# Altium footprint library BRT_Components.PcbLib: 132 footprints (part 8 of 9)
Each footprint in its own frame and in the unit in brackets; x right, y up, seen from the top. Pads: shape width x height; smd on the part's side, far side on the other; paste and mask are expansions set on the pad; w line width, h text height; cw(c..) or ccw(c..) is an arc to the next point about the centre after c.
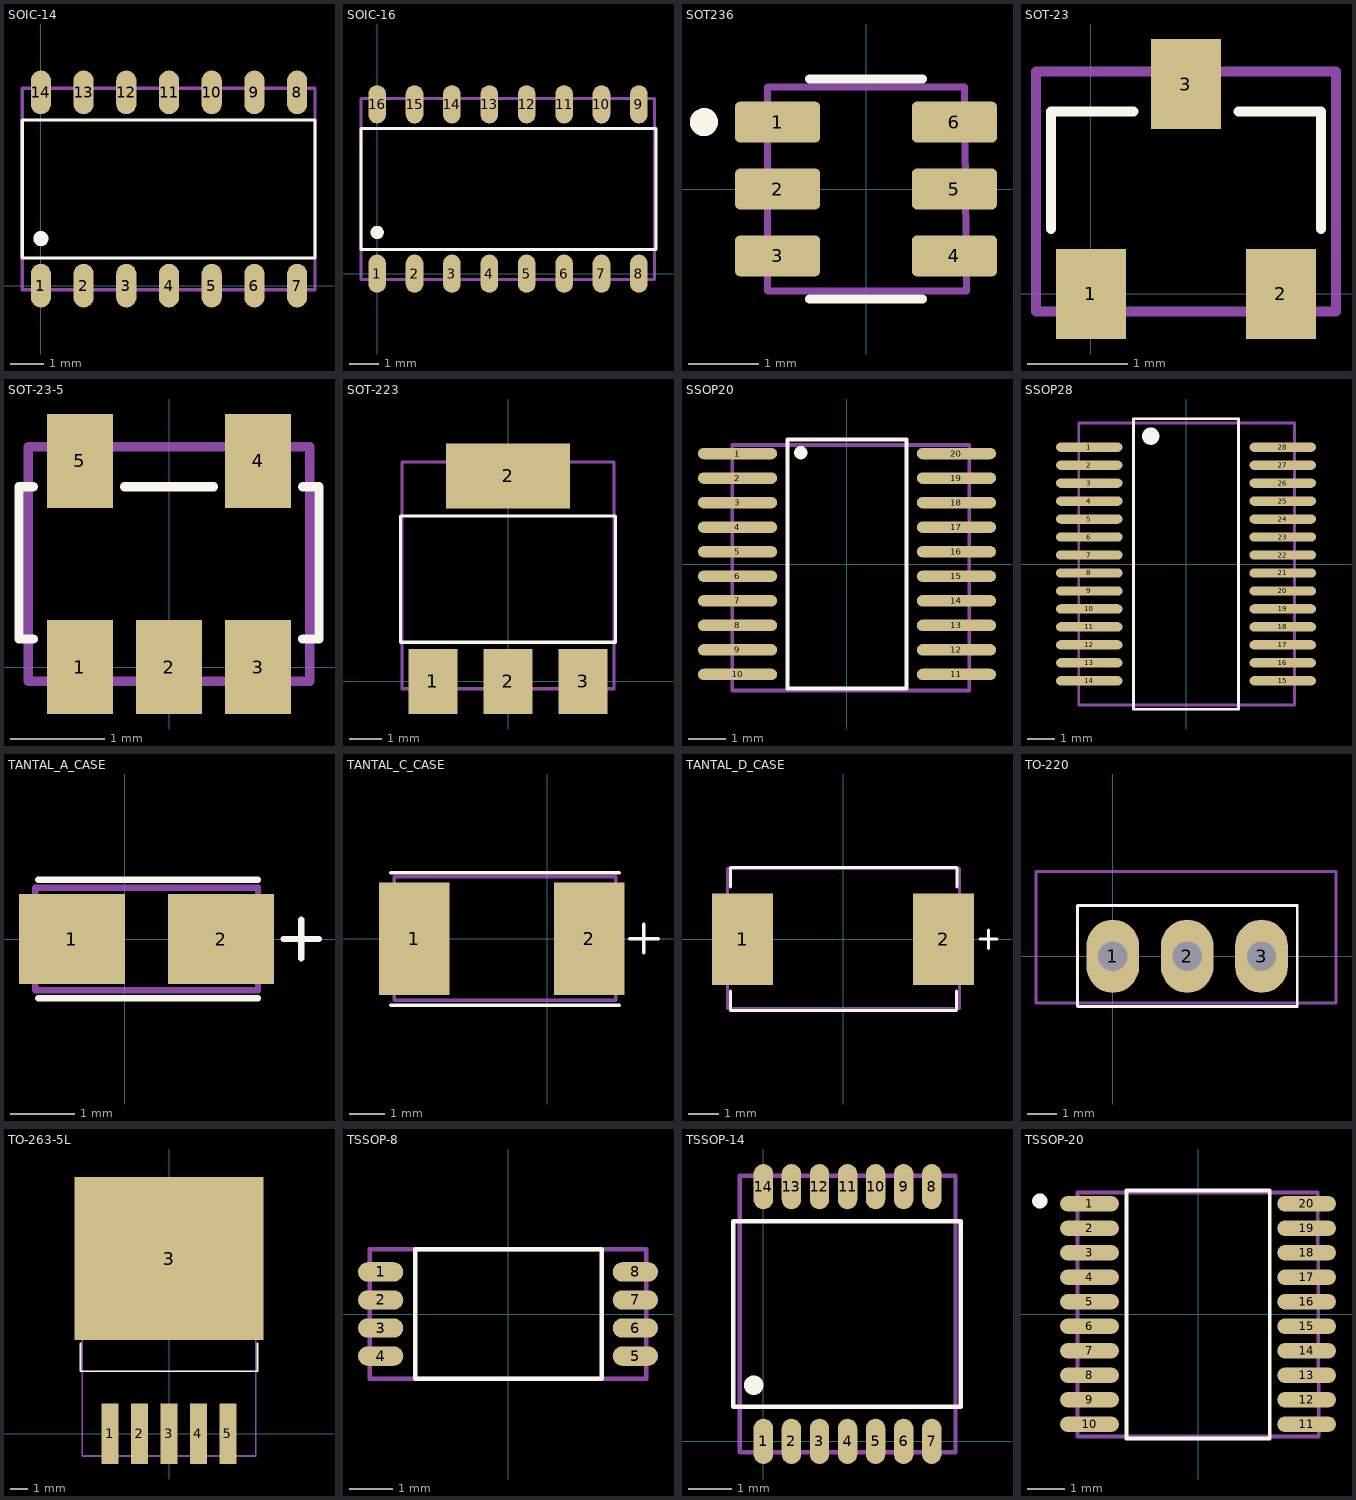
[diagram p7: the footprints below, top view; thin cyan lines are the x and y axes]

## SOIC-14 [mm]
pads (14):
  oval 0.6x1.3 smd paste+0 mask+0.1: 1(0,0) 2(1.27,0) 3(2.54,0) 4(3.81,0) 5(5.08,0) 6(6.35,0) 7(7.62,0) 8(7.62,5.75) 9(6.35,5.75) 10(5.08,5.75) 11(3.81,5.75) 12(2.54,5.75) 13(1.27,5.75) 14(0,5.75)
Top Overlay:
  circle w0.25: c0,1.4 r0.1
  lines w0.1: -0.55,0.825 8.15,0.825 8.15,4.925 -0.55,4.925 -0.55,0.825
Mechanical 13:
  lines w0.1: -0.55,-0.125 -0.55,5.875 8.15,5.875 8.15,-0.125 -0.55,-0.125
3D body "step_temp.STEP": height 1.75, standoff 0, extent -0.525,-0.125 8.125,5.875

## SOIC-16 [mm]
pads (16):
  oval 0.6x1.3 smd paste+0 mask+0.1: 1(0,0) 2(1.27,0) 3(2.54,0) 4(3.81,0) 5(5.08,0) 6(6.35,0) 7(7.62,0) 8(8.89,0) 9(8.89,5.75) 10(7.62,5.75) 11(6.35,5.75) 12(5.08,5.75) 13(3.81,5.75) 14(2.54,5.75) 15(1.27,5.75) 16(0,5.75)
Top Overlay:
  circle w0.25: c0,1.4 r0.1
  lines w0.1: -0.55,0.825 -0.55,4.925 9.475,4.925 9.475,0.825 -0.55,0.825
Mechanical 13:
  lines w0.1: -0.55,-0.2 9.425,-0.2 9.425,5.95 -0.55,5.95 -0.55,-0.2
3D body "User Library-so16-1.step": height 1.78, standoff 0.01, extent -0.535,-0.193 9.435,5.944

## SOT236 [mm]
pads (6):
  rrect25% 1.21x0.58 smd: 1(-1.255,0.95) 2(-1.255,0) 3(-1.255,-0.95) 4(1.255,-0.95) 5(1.255,0) 6(1.255,0.95)
Top Overlay:
  circle w0.2: c-2.3,0.95 r0.1
  lines w0.127: -0.8,-1.56 0.8,-1.56 ; -0.8,1.56 0.8,1.56
Mechanical 13:
  lines w0.1: -1.4,-1.45 -1.4,1.45 1.4,1.45 1.425,-1.45 -1.4,-1.45
3D body "TPD2S017DBVR.STEP": height 1.45, standoff 0, extent -1.4,-1.45 1.4,1.45

## SOT-23 [mm]
pads (3):
  rect 0.7x0.9 smd: 1(0,0) 2(1.9,0) 3(0.95,2.1)
Top Overlay:
  lines w0.1: -0.4,0.65 -0.4,1.825 0.425,1.825 ; 1.475,1.825 2.3,1.825 2.3,0.65
Mechanical 13:
  lines w0.1: -0.55,-0.175 -0.55,2.225 2.45,2.225 2.45,-0.175 -0.55,-0.175
3D body "sot23 v2.step": height 1.1, standoff 0, extent -0.55,-0.175 2.45,2.225

## SOT-23-5 [mm]
pads (5):
  rect 0.7x1 smd mask+0.045: 1(-0.95,0) 2(0,0) 3(0.95,0) 4(0.95,2.2) 5(-0.95,2.2)
Top Overlay:
  lines w0.1: -1.45,0.3 -1.6,0.3 -1.6,1.925 -1.45,1.925 ; -0.475,1.925 0.475,1.925 ; 1.425,0.3 1.6,0.3 1.6,1.925 1.425,1.925
Mechanical 13:
  lines w0.1: -1.5,-0.15 1.5,-0.15 1.5,2.35 -1.5,2.35 -1.5,-0.15
3D body "CircuitWorks-SOT-23-5.step": height 1.1, standoff 0, extent -1.5,-0.15 1.5,2.35

## SOT-223 [mm]
pads (4):
  rect 1.5x2 smd: 1(-2.3,0) 2(0,0) 3(2.3,0)
  rect 3.8x2 smd: 2(0,6.3)
Top Overlay:
  lines w0.1: -3.3,1.2 3.3,1.2 3.3,5.075 -3.3,5.075 -3.3,1.2
Mechanical 13:
  lines w0.1: -3.25,-0.225 3.25,-0.225 3.25,6.73 -3.25,6.73 -3.25,-0.225
3D body "SOT-223.step": height 1.7, standoff 0.02, extent -3.25,-0.23 3.25,6.73

## SSOP20 [mm] "SOP, 20-Leads, Body 6.6x4.5mm, Pitch 0.65mm, IPC Low Density"
height 1.2
pads (20):
  oval 2.1x0.3 smd: 1(-2.9,2.925) 2(-2.9,2.275) 3(-2.9,1.625) 4(-2.9,0.975) 5(-2.9,0.325) 6(-2.9,-0.325) 7(-2.9,-0.975) 8(-2.9,-1.625) 9(-2.9,-2.275) 10(-2.9,-2.925) 11(2.9,-2.925) 12(2.9,-2.275) 13(2.9,-1.625) 14(2.9,-0.975) 15(2.9,-0.325) 16(2.9,0.325) 17(2.9,0.975) 18(2.9,1.625) 19(2.9,2.275) 20(2.9,2.925)
Top Overlay:
  circle w0.25: c-1.225,2.95 r0.05
  lines w0.1: -1.575,-3.3 1.575,-3.3 1.575,3.3 -1.575,3.3 -1.575,-3.3
Mechanical 13:
  lines w0.1: -3.04,-3.35 -3.04,3.15 3.24,3.15 3.24,-3.35 -3.04,-3.35
3D body "TSSOP20_TP.STEP": height 1.1, standoff -0.09, extent -3.04,-3.35 3.24,3.15

## SSOP28 [mm] "SOP, 28-Leads, Body 10.2x5.3mm, Pitch 0.65mm, IPC Low Density"
height 2
pads (28):
  oval 2.4x0.34 smd: 1(-3.5,4.225) 2(-3.5,3.575) 3(-3.5,2.925) 4(-3.5,2.275) 5(-3.5,1.625) 6(-3.5,0.975) 7(-3.5,0.325) 8(-3.5,-0.325) 9(-3.5,-0.975) 10(-3.5,-1.625) 11(-3.5,-2.275) 12(-3.5,-2.925) 13(-3.5,-3.575) 14(-3.5,-4.225) 15(3.5,-4.225) 16(3.5,-3.575) 17(3.5,-2.925) 18(3.5,-2.275) 19(3.5,-1.625) 20(3.5,-0.975) 21(3.5,-0.325) 22(3.5,0.325) 23(3.5,0.975) 24(3.5,1.625) 25(3.5,2.275) 26(3.5,2.925) 27(3.5,3.575) 28(3.5,4.225)
Top Overlay:
  lines w0.1: -1.9,-5.25 1.9,-5.25 1.9,5.25 -1.9,5.25 -1.9,-5.25
  lines w0.32: -1.123,4.64 ccw(c-1.275,4.625) -1.123,4.629
Mechanical 13:
  lines w0.1: -3.875,-5.1 3.925,-5.1 3.925,5.1 -3.875,5.1 -3.875,-5.1
3D body "SSOP-28-3.STEP": height 1.9, standoff 0, extent -3.875,-5.1 3.925,5.1

## TANTAL_A_CASE [mm]
pads (2):
  rect 1.65x1.4 smd: 1(-0.825,0) 2(1.5,0)
Top Overlay:
  lines w0.1: -1.35,-0.925 2.075,-0.925 ; -1.35,0.925 2.075,0.925 ; 2.475,0 3.025,0 ; 2.75,-0.3 2.75,0.3
Mechanical 13:
  lines w0.1: -1.4,-0.8 -1.4,0.8 2.075,0.8 2.075,-0.8 -1.4,-0.8
3D body "Tantal_A.step": height 1.65, standoff -0.01, extent -1.394,-0.8 2.069,0.8

## TANTAL_C_CASE [mm]
pads (2):
  rect 2x3.2 smd: 1(-3.775,0) 2(1.2,0)
Top Overlay:
  lines w0.1: -4.45,-1.9 2.05,-1.9 ; -4.45,1.875 2.05,1.875 ; 2.35,0 3.15,0 ; 2.75,-0.4 2.75,0.4
Mechanical 13:
  lines w0.1: -4.35,-1.75 -4.35,1.75 1.95,1.75 1.95,-1.75 -4.35,-1.75
3D body "Tantal_C.step": height 2.81, standoff 0.01, extent -4.35,-1.75 1.95,1.75

## TANTAL_D_CASE [mm]
pads (2):
  rect 2x3 smd: 1(-3.3,0) 2(3.3,0)
Top Overlay:
  lines w0.1: -3.7,-1.7 -3.7,-2.35 3.725,-2.35 3.725,-1.7 ; -3.694,1.706 -3.694,2.356 3.731,2.356 3.731,1.706 ; 4.5,0 5.05,0 ; 4.775,-0.3 4.775,0.3
Mechanical 13:
  lines w0.1: -3.8,-2.275 3.825,-2.275 3.825,2.325 -3.8,2.325 -3.8,-2.275
3D body "t495d107k016ate100.stp": height 3.11, standoff 0.01, extent -3.8,-2.275 3.8,2.325

## TO-220 [mm]
pads (3):
  oval 1.8x2.5 hole 1: 1(0,0) 2(2.54,0) 3(5.08,0)
Top Overlay:
  lines w0.1: -1.2,-1.725 6.3,-1.725 6.3,1.725 -1.2,1.725 -1.2,-1.725
Mechanical 13:
  lines w0.1: -2.625,-1.6 -2.625,2.9 7.625,2.9 7.625,-1.6 -2.625,-1.6
3D body "MOSFET.SLDPRT": height 19.75, standoff -9.25, extent -2.6,-1.6 7.6,2.9

## TO-263-5L [mm]
pads (6):
  rect 1x3.5 smd: 1(-3.4,0) 2(-1.7,0) 3(0,0) 4(1.7,0) 5(3.4,0)
  rect 10.9x9.4 smd: 3(0,10.1)
Top Overlay:
  lines w0.1: -5.1,5.2 -5.1,3.6 5.1,3.6 5.1,5.2
Mechanical 13:
  lines w0.1: -5,-1.29 -5,14.38 5,14.38 5,-1.29 -5,-1.29
3D body "User Library-TO263-5.STEP": height 4.83, standoff 0.03, extent -5,-1.29 5,14.38

## TSSOP-8 [mm]
pads (8):
  oval 1.05x0.45 smd paste+0 mask+0.1: 1(-2.95,0.975) 2(-2.95,0.325) 3(-2.95,-0.325) 4(-2.95,-0.975) 5(2.95,-0.975) 6(2.95,-0.325) 7(2.95,0.325) 8(2.95,0.975)
Top Overlay:
  lines w0.1: -2.15,-1.5 2.175,-1.5 2.175,1.5 -2.15,1.5 -2.15,-1.5
Mechanical 13:
  lines w0.1: -3.2,-1.5 3.2,-1.5 3.2,1.5 -3.2,1.5 -3.2,-1.5
3D body "UCC2946PW.STEP": height 1.2, standoff 0, extent -3.2,-1.5 3.2,1.5

## TSSOP-14 [mm]
pads (14):
  oval 0.45x1.05 smd paste+0 mask+0.1: 1(0,0) 2(0.65,0) 3(1.3,0) 4(1.95,0) 5(2.6,0) 6(3.25,0) 7(3.9,0) 8(3.9,5.9) 9(3.25,5.9) 10(2.6,5.9) 11(1.95,5.9) 12(1.3,5.9) 13(0.65,5.9) 14(0,5.9)
Top Overlay:
  circle w0.25: c-0.225,1.3 r0.1
  lines w0.1: -0.7,0.8 4.575,0.8 4.575,5.1 -0.7,5.1 -0.7,0.8
Mechanical 13:
  lines w0.1: -0.55,-0.25 -0.55,6.15 4.45,6.15 4.45,-0.25 -0.55,-0.25
3D body "TSSOP14-1.step": height 1.1, standoff 0, extent -0.55,-0.25 4.45,6.15

## TSSOP-20 [mm]
pads (20):
  oval 1.56x0.41 smd: 1(-2.88,2.925) 2(-2.88,2.275) 3(-2.88,1.625) 4(-2.88,0.975) 5(-2.88,0.325) 6(-2.88,-0.325) 7(-2.88,-0.975) 8(-2.88,-1.625) 9(-2.88,-2.275) 10(-2.88,-2.925) 11(2.88,-2.925) 12(2.88,-2.275) 13(2.88,-1.625) 14(2.88,-0.975) 15(2.88,-0.325) 16(2.88,0.325) 17(2.88,0.975) 18(2.88,1.625) 19(2.88,2.275) 20(2.88,2.925)
Top Overlay:
  circle w0.2: c-4.2,3 r0.1
  lines w0.1: -1.9,-3.3 -1.9,3.275 1.9,3.275 1.9,-3.3 -1.9,-3.3
Mechanical 13:
  lines w0.1: -3.2,-3.25 -3.2,3.225 3.175,3.225 3.2,-3.25 -3.2,-3.25
3D body "STM32F030F4P6--3DModel-STEP-56544.STEP": height 1.18, standoff -0.02, extent -3.2,-3.25 3.2,3.25